# Altium schematic symbol library jlcpcb_2025_04_capacitors_extended_0402.schlib: 3594 symbols (part 13 of 20)
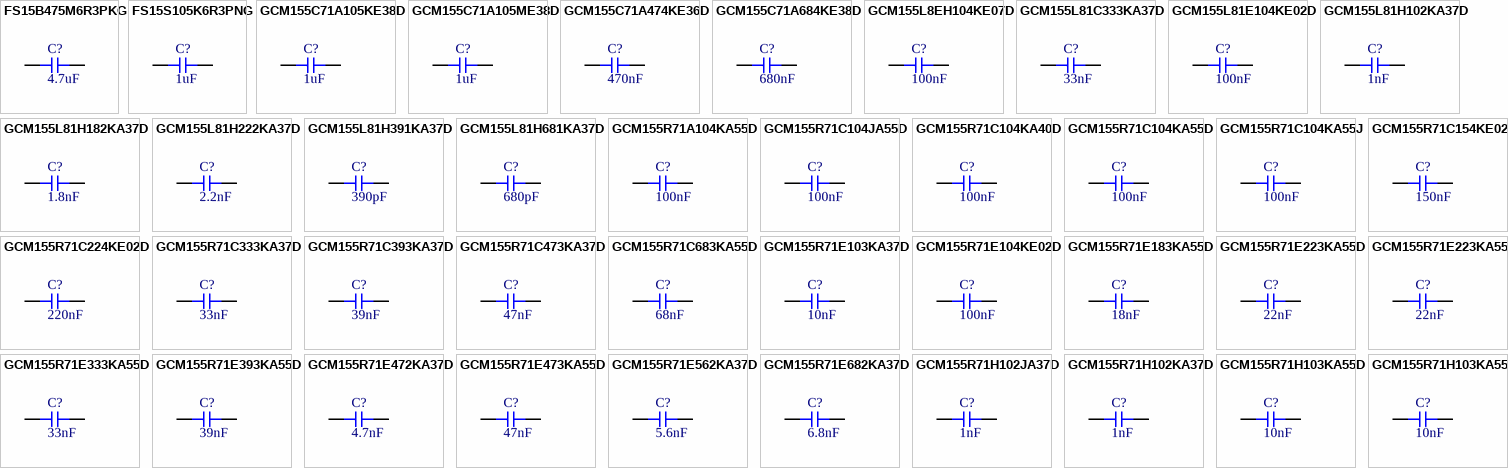
[diagram p101: symbols FS15B475M6R3PKG to GCM155R71H103KA55J]

## GCM155R71E393KA55D
designator C?  Capacitance: 39nF  (hidden comment: *)
Capacitor, Ceramic (MLCC), 39nF, ±10%, 25V, X7R, ±10%, SMD 0402; Manufacturer: Murata Electronics; Manufacturer Part Number: GCM155R71E393KA55D; Package Size: 0402; JLCPCB Basic Part: No; JLCPCB Part Number: C408119; Supplier 1: LCSC; Category: Capacitors - MLCC; Supplier Part Number 1: C408119; Tolerance: ±10%; Voltage Rating: 25V; Temperature Coefficient: X7R; RoHS: Yes; ComponentLink1Description: Datasheet; ComponentLink1URL: https://wmsc.lcsc.com/wmsc/upload/file/pdf/v2/lcsc/2304140030_Murata-Electronics-GCM155R71E393KA55D_C408119.pdf; ComponentLink2Description: JLCPCB Part URL; ComponentLink2URL: https://jlcpcb.com/partdetail/C408119; ComponentLink3Description: LCSC Part URL; ComponentLink3URL: https://lcsc.com/product-detail/Multilayer-Ceramic-Capacitors-MLCC---SMD-SMT_Murata-Electronics-Murata-Electronics-GCM155R71E393KA55D_C408119.html
footprint CAP-0402 (0402 (1005M) Capacitor)
pins: 1, 2

## GCM155R71E472KA37D
designator C?  Capacitance: 4.7nF  (hidden comment: *)
Capacitor, Ceramic (MLCC), 4.7nF, ±10%, 25V, ±10%, SMD 0402; Manufacturer: Murata Electronics; Manufacturer Part Number: GCM155R71E472KA37D; Package Size: 0402; JLCPCB Basic Part: No; JLCPCB Part Number: C701297; Supplier 1: LCSC; Category: Capacitors - MLCC; Supplier Part Number 1: C701297; Tolerance: ±10%; Voltage Rating: 25V; RoHS: Yes; ComponentLink1Description: Datasheet; ComponentLink1URL: https://wmsc.lcsc.com/wmsc/upload/file/pdf/v2/lcsc/2304140030_Murata-Electronics-GCM155R71E472KA37D_C701297.pdf; ComponentLink2Description: JLCPCB Part URL; ComponentLink2URL: https://jlcpcb.com/partdetail/C701297; ComponentLink3Description: LCSC Part URL; ComponentLink3URL: https://lcsc.com/product-detail/Multilayer-Ceramic-Capacitors-MLCC---SMD-SMT_Murata-Electronics-Murata-Electronics-GCM155R71E472KA37D_C701297.html
footprint CAP-0402 (0402 (1005M) Capacitor)
pins: 1, 2

## GCM155R71E473KA55D
designator C?  Capacitance: 47nF  (hidden comment: *)
Capacitor, Ceramic (MLCC), 47nF, ±10%, 25V, X7R, ±10%, SMD 0402; Manufacturer: Murata Electronics; Manufacturer Part Number: GCM155R71E473KA55D; Package Size: 0402; JLCPCB Basic Part: No; JLCPCB Part Number: C126529; Supplier 1: LCSC; Category: Capacitors - MLCC; Supplier Part Number 1: C126529; Tolerance: ±10%; Voltage Rating: 25V; Temperature Coefficient: X7R; RoHS: Yes; ComponentLink1Description: Datasheet; ComponentLink1URL: https://wmsc.lcsc.com/wmsc/upload/file/pdf/v2/lcsc/1811081516_Murata-Electronics-GCM155R71E473KA55D_C126529.pdf; ComponentLink2Description: JLCPCB Part URL; ComponentLink2URL: https://jlcpcb.com/partdetail/C126529; ComponentLink3Description: LCSC Part URL; ComponentLink3URL: https://lcsc.com/product-detail/Multilayer-Ceramic-Capacitors-MLCC---SMD-SMT_Murata-Electronics-Murata-Electronics-GCM155R71E473KA55D_C126529.html
footprint CAP-0402 (0402 (1005M) Capacitor)
pins: 1, 2

## GCM155R71E562KA37D
designator C?  Capacitance: 5.6nF  (hidden comment: *)
Capacitor, Ceramic (MLCC), 5.6nF, ±10%, 25V, X7R, ±10%, SMD 0402; Manufacturer: Murata Electronics; Manufacturer Part Number: GCM155R71E562KA37D; Package Size: 0402; JLCPCB Basic Part: No; JLCPCB Part Number: C2941943; Supplier 1: LCSC; Category: Capacitors - MLCC; Supplier Part Number 1: C2941943; Tolerance: ±10%; Voltage Rating: 25V; Temperature Coefficient: X7R; RoHS: Yes; ComponentLink1Description: Datasheet; ComponentLink1URL: https://wmsc.lcsc.com/wmsc/upload/file/pdf/v2/lcsc/2201121900_Murata-Electronics-GCM155R71E562KA37D_C2941943.pdf; ComponentLink2Description: JLCPCB Part URL; ComponentLink2URL: https://jlcpcb.com/partdetail/C2941943; ComponentLink3Description: LCSC Part URL; ComponentLink3URL: https://lcsc.com/product-detail/Multilayer-Ceramic-Capacitors-MLCC---SMD-SMT_Murata-Electronics-Murata-Electronics-GCM155R71E562KA37D_C2941943.html
footprint CAP-0402 (0402 (1005M) Capacitor)
pins: 1, 2

## GCM155R71E682KA37D
designator C?  Capacitance: 6.8nF  (hidden comment: *)
Capacitor, Ceramic (MLCC), 6.8nF, ±10%, 25V, X7R, ±10%, SMD 0402; Manufacturer: Murata Electronics; Manufacturer Part Number: GCM155R71E682KA37D; Package Size: 0402; JLCPCB Basic Part: No; JLCPCB Part Number: C710665; Supplier 1: LCSC; Category: Capacitors - MLCC; Supplier Part Number 1: C710665; Tolerance: ±10%; Voltage Rating: 25V; Temperature Coefficient: X7R; RoHS: Yes; ComponentLink1Description: Datasheet; ComponentLink1URL: https://wmsc.lcsc.com/wmsc/upload/file/pdf/v2/lcsc/2210190600_Murata-Electronics-GCM155R71E682KA37D_C710665.pdf; ComponentLink2Description: JLCPCB Part URL; ComponentLink2URL: https://jlcpcb.com/partdetail/C710665; ComponentLink3Description: LCSC Part URL; ComponentLink3URL: https://lcsc.com/product-detail/Multilayer-Ceramic-Capacitors-MLCC---SMD-SMT_Murata-Electronics-Murata-Electronics-GCM155R71E682KA37D_C710665.html
footprint CAP-0402 (0402 (1005M) Capacitor)
pins: 1, 2

## GCM155R71H102JA37D
designator C?  Capacitance: 1nF  (hidden comment: *)
Capacitor, Ceramic (MLCC), 1nF, ±5%, ±5%, SMD 0402; Manufacturer: Murata Electronics; Manufacturer Part Number: GCM155R71H102JA37D; Package Size: 0402; JLCPCB Basic Part: No; JLCPCB Part Number: C668319; Supplier 1: LCSC; Category: Capacitors - MLCC; Supplier Part Number 1: C668319; Tolerance: ±5%; RoHS: Yes; ComponentLink1Description: Datasheet; ComponentLink1URL: https://wmsc.lcsc.com/wmsc/upload/file/pdf/v2/lcsc/2201131030_Murata-Electronics-GCM155R71H102JA37D_C668319.pdf; ComponentLink2Description: JLCPCB Part URL; ComponentLink2URL: https://jlcpcb.com/partdetail/C668319; ComponentLink3Description: LCSC Part URL; ComponentLink3URL: https://lcsc.com/product-detail/Multilayer-Ceramic-Capacitors-MLCC---SMD-SMT_Murata-Electronics-Murata-Electronics-GCM155R71H102JA37D_C668319.html
footprint CAP-0402 (0402 (1005M) Capacitor)
pins: 1, 2

## GCM155R71H102KA37D
designator C?  Capacitance: 1nF  (hidden comment: *)
Capacitor, Ceramic (MLCC), 1nF, ±10%, 50V, X7R, ±10%, SMD 0402; Manufacturer: Murata Electronics; Manufacturer Part Number: GCM155R71H102KA37D; Package Size: 0402; JLCPCB Basic Part: No; JLCPCB Part Number: C126532; Supplier 1: LCSC; Category: Capacitors - MLCC; Supplier Part Number 1: C126532; Tolerance: ±10%; Voltage Rating: 50V; Temperature Coefficient: X7R; RoHS: Yes; ComponentLink1Description: Datasheet; ComponentLink1URL: https://wmsc.lcsc.com/wmsc/upload/file/pdf/v2/lcsc/1811081510_Murata-Electronics-GCM155R71H102KA37D_C126532.pdf; ComponentLink2Description: JLCPCB Part URL; ComponentLink2URL: https://jlcpcb.com/partdetail/C126532; ComponentLink3Description: LCSC Part URL; ComponentLink3URL: https://lcsc.com/product-detail/Multilayer-Ceramic-Capacitors-MLCC---SMD-SMT_Murata-Electronics-Murata-Electronics-GCM155R71H102KA37D_C126532.html
footprint CAP-0402 (0402 (1005M) Capacitor)
pins: 1, 2

## GCM155R71H103KA55D
designator C?  Capacitance: 10nF  (hidden comment: *)
Capacitor, Ceramic (MLCC), 10nF, ±10%, 50V, X7R, ±10%, SMD 0402; Manufacturer: Murata Electronics; Manufacturer Part Number: GCM155R71H103KA55D; Package Size: 0402; JLCPCB Basic Part: No; JLCPCB Part Number: C91601; Supplier 1: LCSC; Category: Capacitors - MLCC; Supplier Part Number 1: C91601; Tolerance: ±10%; Voltage Rating: 50V; Temperature Coefficient: X7R; RoHS: Yes; ComponentLink1Description: Datasheet; ComponentLink1URL: https://wmsc.lcsc.com/wmsc/upload/file/pdf/v2/lcsc/1811141852_Murata-Electronics-GCM155R71H103KA55D_C91601.pdf; ComponentLink2Description: JLCPCB Part URL; ComponentLink2URL: https://jlcpcb.com/partdetail/C91601; ComponentLink3Description: LCSC Part URL; ComponentLink3URL: https://lcsc.com/product-detail/Multilayer-Ceramic-Capacitors-MLCC---SMD-SMT_Murata-Electronics-Murata-Electronics-GCM155R71H103KA55D_C91601.html
footprint CAP-0402 (0402 (1005M) Capacitor)
pins: 1, 2

## GCM155R71H103KA55J
designator C?  Capacitance: 10nF  (hidden comment: *)
Capacitor, Ceramic (MLCC), 10nF, ±10%, 50V, X7R, ±10%, SMD 0402; Manufacturer: Murata Electronics; Manufacturer Part Number: GCM155R71H103KA55J; Package Size: 0402; JLCPCB Basic Part: No; JLCPCB Part Number: C2168451; Supplier 1: LCSC; Category: Capacitors - MLCC; Supplier Part Number 1: C2168451; Tolerance: ±10%; Voltage Rating: 50V; Temperature Coefficient: X7R; RoHS: Yes; ComponentLink1Description: Datasheet; ComponentLink1URL: https://wmsc.lcsc.com/wmsc/upload/file/pdf/v2/lcsc/2202040300_Murata-Electronics-GCM155R71H103KA55J_C2168451.pdf; ComponentLink2Description: JLCPCB Part URL; ComponentLink2URL: https://jlcpcb.com/partdetail/C2168451; ComponentLink3Description: LCSC Part URL; ComponentLink3URL: https://lcsc.com/product-detail/Multilayer-Ceramic-Capacitors-MLCC---SMD-SMT_Murata-Electronics-Murata-Electronics-GCM155R71H103KA55J_C2168451.html
footprint CAP-0402 (0402 (1005M) Capacitor)
pins: 1, 2

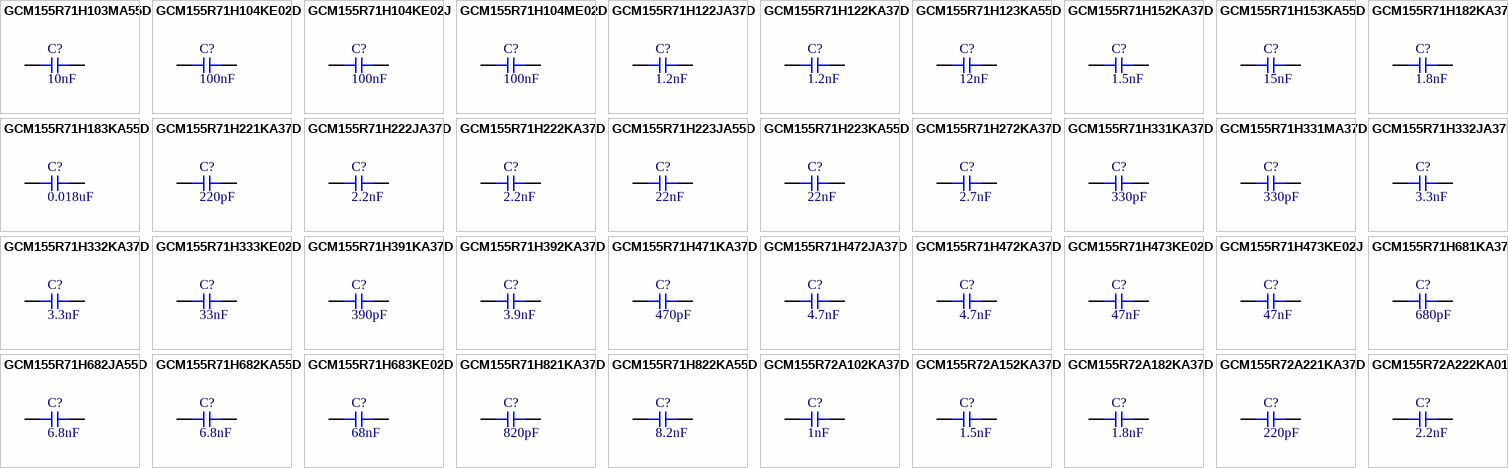
[diagram p56: symbols GCM155R71H103MA55D to GCM155R72A222KA01D]

## GCM155R71H103MA55D
designator C?  Capacitance: 10nF  (hidden comment: *)
Capacitor, Ceramic (MLCC), 10nF, ±20%, 50V, X7R, ±20%, SMD 0402; Manufacturer: Murata Electronics; Manufacturer Part Number: GCM155R71H103MA55D; Package Size: 0402; JLCPCB Basic Part: No; JLCPCB Part Number: C2941923; Supplier 1: LCSC; Category: Capacitors - MLCC; Supplier Part Number 1: C2941923; Tolerance: ±20%; Voltage Rating: 50V; Temperature Coefficient: X7R; RoHS: Yes; ComponentLink1Description: Datasheet; ComponentLink1URL: https://wmsc.lcsc.com/wmsc/upload/file/pdf/v2/lcsc/2201211500_Murata-Electronics-GCM155R71H103MA55D_C2941923.pdf; ComponentLink2Description: JLCPCB Part URL; ComponentLink2URL: https://jlcpcb.com/partdetail/C2941923; ComponentLink3Description: LCSC Part URL; ComponentLink3URL: https://lcsc.com/product-detail/Multilayer-Ceramic-Capacitors-MLCC---SMD-SMT_Murata-Electronics-Murata-Electronics-GCM155R71H103MA55D_C2941923.html
footprint CAP-0402 (0402 (1005M) Capacitor)
pins: 1, 2

## GCM155R71H104KE02D
designator C?  Capacitance: 100nF  (hidden comment: *)
Capacitor, Ceramic (MLCC), 100nF, ±10%, 50V, X7R, ±10%, SMD 0402; Manufacturer: Murata Electronics; Manufacturer Part Number: GCM155R71H104KE02D; Package Size: 0402; JLCPCB Basic Part: No; JLCPCB Part Number: C85858; Supplier 1: LCSC; Category: Capacitors - MLCC; Supplier Part Number 1: C85858; Tolerance: ±10%; Voltage Rating: 50V; Temperature Coefficient: X7R; RoHS: Yes; ComponentLink1Description: Datasheet; ComponentLink1URL: https://wmsc.lcsc.com/wmsc/upload/file/pdf/v2/lcsc/2304140030_Murata-Electronics-GCM155R71H104KE02D_C85858.pdf; ComponentLink2Description: JLCPCB Part URL; ComponentLink2URL: https://jlcpcb.com/partdetail/C85858; ComponentLink3Description: LCSC Part URL; ComponentLink3URL: https://lcsc.com/product-detail/Multilayer-Ceramic-Capacitors-MLCC---SMD-SMT_Murata-Electronics-Murata-Electronics-GCM155R71H104KE02D_C85858.html
footprint CAP-0402 (0402 (1005M) Capacitor)
pins: 1, 2

## GCM155R71H104KE02J
designator C?  Capacitance: 100nF  (hidden comment: *)
Capacitor, Ceramic (MLCC), 100nF, 50V, SMD 0402; Manufacturer: Murata Electronics; Manufacturer Part Number: GCM155R71H104KE02J; Package Size: 0402; JLCPCB Basic Part: No; JLCPCB Part Number: C2649549; Supplier 1: LCSC; Category: Capacitors - MLCC; Supplier Part Number 1: C2649549; Voltage Rating: 50V; RoHS: Yes; ComponentLink1Description: Datasheet; ComponentLink1URL: https://wmsc.lcsc.com/wmsc/upload/file/pdf/v2/lcsc/2202131630_Murata-Electronics-GCM155R71H104KE02J_C2649549.pdf; ComponentLink2Description: JLCPCB Part URL; ComponentLink2URL: https://jlcpcb.com/partdetail/C2649549; ComponentLink3Description: LCSC Part URL; ComponentLink3URL: https://lcsc.com/product-detail/Multilayer-Ceramic-Capacitors-MLCC---SMD-SMT_Murata-Electronics-Murata-Electronics-GCM155R71H104KE02J_C2649549.html
footprint CAP-0402 (0402 (1005M) Capacitor)
pins: 1, 2

## GCM155R71H104ME02D
designator C?  Capacitance: 100nF  (hidden comment: *)
Capacitor, Ceramic (MLCC), 100nF, ±20%, 50V, X7R, ±20%, SMD 0402; Manufacturer: Murata Electronics; Manufacturer Part Number: GCM155R71H104ME02D; Package Size: 0402; JLCPCB Basic Part: No; JLCPCB Part Number: C710666; Supplier 1: LCSC; Category: Capacitors - MLCC; Supplier Part Number 1: C710666; Tolerance: ±20%; Voltage Rating: 50V; Temperature Coefficient: X7R; RoHS: Yes; ComponentLink1Description: Datasheet; ComponentLink1URL: https://wmsc.lcsc.com/wmsc/upload/file/pdf/v2/lcsc/2308111600_Murata-Electronics-GCM155R71H104ME02D_C710666.pdf; ComponentLink2Description: JLCPCB Part URL; ComponentLink2URL: https://jlcpcb.com/partdetail/C710666; ComponentLink3Description: LCSC Part URL; ComponentLink3URL: https://lcsc.com/product-detail/Multilayer-Ceramic-Capacitors-MLCC---SMD-SMT_Murata-Electronics-Murata-Electronics-GCM155R71H104ME02D_C710666.html
footprint CAP-0402 (0402 (1005M) Capacitor)
pins: 1, 2

## GCM155R71H122JA37D
designator C?  Capacitance: 1.2nF  (hidden comment: *)
Capacitor, Ceramic (MLCC), 1.2nF, ±5%, 50V, X7R, ±5%, SMD 0402; Manufacturer: Murata Electronics; Manufacturer Part Number: GCM155R71H122JA37D; Package Size: 0402; JLCPCB Basic Part: No; JLCPCB Part Number: C5119306; Supplier 1: LCSC; Category: Capacitors - MLCC; Supplier Part Number 1: C5119306; Tolerance: ±5%; Voltage Rating: 50V; Temperature Coefficient: X7R; RoHS: Yes; ComponentLink1Description: Datasheet; ComponentLink1URL: https://wmsc.lcsc.com/wmsc/upload/file/pdf/v2/lcsc/2207251801_Murata-Electronics-GCM155R71H122JA37D_C5119306.pdf; ComponentLink2Description: JLCPCB Part URL; ComponentLink2URL: https://jlcpcb.com/partdetail/C5119306; ComponentLink3Description: LCSC Part URL; ComponentLink3URL: https://lcsc.com/product-detail/Multilayer-Ceramic-Capacitors-MLCC---SMD-SMT_Murata-Electronics-Murata-Electronics-GCM155R71H122JA37D_C5119306.html
footprint CAP-0402 (0402 (1005M) Capacitor)
pins: 1, 2

## GCM155R71H122KA37D
designator C?  Capacitance: 1.2nF  (hidden comment: *)
Capacitor, Ceramic (MLCC), 1.2nF, ±10%, 50V, X7R, ±10%, SMD 0402; Manufacturer: Murata Electronics; Manufacturer Part Number: GCM155R71H122KA37D; Package Size: 0402; JLCPCB Basic Part: No; JLCPCB Part Number: C393671; Supplier 1: LCSC; Category: Capacitors - MLCC; Supplier Part Number 1: C393671; Tolerance: ±10%; Voltage Rating: 50V; Temperature Coefficient: X7R; RoHS: Yes; ComponentLink1Description: Datasheet; ComponentLink1URL: https://wmsc.lcsc.com/wmsc/upload/file/pdf/v2/lcsc/1912111437_Murata-Electronics-GCM155R71H122KA37D_C393671.pdf; ComponentLink2Description: JLCPCB Part URL; ComponentLink2URL: https://jlcpcb.com/partdetail/C393671; ComponentLink3Description: LCSC Part URL; ComponentLink3URL: https://lcsc.com/product-detail/Multilayer-Ceramic-Capacitors-MLCC---SMD-SMT_Murata-Electronics-Murata-Electronics-GCM155R71H122KA37D_C393671.html
footprint CAP-0402 (0402 (1005M) Capacitor)
pins: 1, 2

## GCM155R71H123KA55D
designator C?  Capacitance: 12nF  (hidden comment: *)
Capacitor, Ceramic (MLCC), 12nF, ±10%, 50V, X7R, ±10%, SMD 0402; Manufacturer: Murata Electronics; Manufacturer Part Number: GCM155R71H123KA55D; Package Size: 0402; JLCPCB Basic Part: No; JLCPCB Part Number: C710667; Supplier 1: LCSC; Category: Capacitors - MLCC; Supplier Part Number 1: C710667; Tolerance: ±10%; Voltage Rating: 50V; Temperature Coefficient: X7R; RoHS: Yes; ComponentLink1Description: Datasheet; ComponentLink1URL: https://wmsc.lcsc.com/wmsc/upload/file/pdf/v2/lcsc/2201111430_Murata-Electronics-GCM155R71H123KA55D_C710667.pdf; ComponentLink2Description: JLCPCB Part URL; ComponentLink2URL: https://jlcpcb.com/partdetail/C710667; ComponentLink3Description: LCSC Part URL; ComponentLink3URL: https://lcsc.com/product-detail/Multilayer-Ceramic-Capacitors-MLCC---SMD-SMT_Murata-Electronics-Murata-Electronics-GCM155R71H123KA55D_C710667.html
footprint CAP-0402 (0402 (1005M) Capacitor)
pins: 1, 2

## GCM155R71H152KA37D
designator C?  Capacitance: 1.5nF  (hidden comment: *)
Capacitor, Ceramic (MLCC), 1.5nF, ±10%, 50V, X7R, ±10%, SMD 0402; Manufacturer: Murata Electronics; Manufacturer Part Number: GCM155R71H152KA37D; Package Size: 0402; JLCPCB Basic Part: No; JLCPCB Part Number: C126533; Supplier 1: LCSC; Category: Capacitors - MLCC; Supplier Part Number 1: C126533; Tolerance: ±10%; Voltage Rating: 50V; Temperature Coefficient: X7R; RoHS: Yes; ComponentLink1Description: Datasheet; ComponentLink1URL: https://wmsc.lcsc.com/wmsc/upload/file/pdf/v2/lcsc/1811081510_Murata-Electronics-GCM155R71H152KA37D_C126533.pdf; ComponentLink2Description: JLCPCB Part URL; ComponentLink2URL: https://jlcpcb.com/partdetail/C126533; ComponentLink3Description: LCSC Part URL; ComponentLink3URL: https://lcsc.com/product-detail/Multilayer-Ceramic-Capacitors-MLCC---SMD-SMT_Murata-Electronics-Murata-Electronics-GCM155R71H152KA37D_C126533.html
footprint CAP-0402 (0402 (1005M) Capacitor)
pins: 1, 2

## GCM155R71H153KA55D
designator C?  Capacitance: 15nF  (hidden comment: *)
Capacitor, Ceramic (MLCC), 15nF, ±10%, 50V, X7R, ±10%, SMD 0402; Manufacturer: Murata Electronics; Manufacturer Part Number: GCM155R71H153KA55D; Package Size: 0402; JLCPCB Basic Part: No; JLCPCB Part Number: C430702; Supplier 1: LCSC; Category: Capacitors - MLCC; Supplier Part Number 1: C430702; Tolerance: ±10%; Voltage Rating: 50V; Temperature Coefficient: X7R; RoHS: Yes; ComponentLink1Description: Datasheet; ComponentLink1URL: https://wmsc.lcsc.com/wmsc/upload/file/pdf/v2/lcsc/2304140030_Murata-Electronics-GCM155R71H153KA55D_C430702.pdf; ComponentLink2Description: JLCPCB Part URL; ComponentLink2URL: https://jlcpcb.com/partdetail/C430702; ComponentLink3Description: LCSC Part URL; ComponentLink3URL: https://lcsc.com/product-detail/Multilayer-Ceramic-Capacitors-MLCC---SMD-SMT_Murata-Electronics-Murata-Electronics-GCM155R71H153KA55D_C430702.html
footprint CAP-0402 (0402 (1005M) Capacitor)
pins: 1, 2

## GCM155R71H182KA37D
designator C?  Capacitance: 1.8nF  (hidden comment: *)
Capacitor, Ceramic (MLCC), 1.8nF, ±10%, null, X7R, ±10%, SMD 0402; Manufacturer: Murata Electronics; Manufacturer Part Number: GCM155R71H182KA37D; Package Size: 0402; JLCPCB Basic Part: No; JLCPCB Part Number: C710668; Supplier 1: LCSC; Category: Capacitors - MLCC; Supplier Part Number 1: C710668; Tolerance: ±10%; Voltage Rating: null; Temperature Coefficient: X7R; RoHS: Yes; ComponentLink1Description: Datasheet; ComponentLink1URL: https://wmsc.lcsc.com/wmsc/upload/file/pdf/v2/lcsc/2105241334_Murata-Electronics-GCM155R71H182KA37D_C710668.pdf; ComponentLink2Description: JLCPCB Part URL; ComponentLink2URL: https://jlcpcb.com/partdetail/C710668; ComponentLink3Description: LCSC Part URL; ComponentLink3URL: https://lcsc.com/product-detail/Multilayer-Ceramic-Capacitors-MLCC---SMD-SMT_Murata-Electronics-Murata-Electronics-GCM155R71H182KA37D_C710668.html
footprint CAP-0402 (0402 (1005M) Capacitor)
pins: 1, 2

## GCM155R71H183KA55D
designator C?  Capacitance: 0.018uF  (hidden comment: *)
Capacitor, Ceramic (MLCC), 0.018uF, ±10%, null, X7R, ±10%, SMD 0402; Manufacturer: Murata Electronics; Manufacturer Part Number: GCM155R71H183KA55D; Package Size: 0402; JLCPCB Basic Part: No; JLCPCB Part Number: C710669; Supplier 1: LCSC; Category: Capacitors - MLCC; Supplier Part Number 1: C710669; Tolerance: ±10%; Voltage Rating: null; Temperature Coefficient: X7R; RoHS: Yes; ComponentLink1Description: Datasheet; ComponentLink1URL: https://wmsc.lcsc.com/wmsc/upload/file/pdf/v2/lcsc/2308111601_Murata-Electronics-GCM155R71H183KA55D_C710669.pdf; ComponentLink2Description: JLCPCB Part URL; ComponentLink2URL: https://jlcpcb.com/partdetail/C710669; ComponentLink3Description: LCSC Part URL; ComponentLink3URL: https://lcsc.com/product-detail/Multilayer-Ceramic-Capacitors-MLCC---SMD-SMT_Murata-Electronics-Murata-Electronics-GCM155R71H183KA55D_C710669.html
footprint CAP-0402 (0402 (1005M) Capacitor)
pins: 1, 2

## GCM155R71H221KA37D
designator C?  Capacitance: 220pF  (hidden comment: *)
Capacitor, Ceramic (MLCC), 220pF, ±10%, 50V, X7R, ±10%, SMD 0402; Manufacturer: Murata Electronics; Manufacturer Part Number: GCM155R71H221KA37D; Package Size: 0402; JLCPCB Basic Part: No; JLCPCB Part Number: C388904; Supplier 1: LCSC; Category: Capacitors - MLCC; Supplier Part Number 1: C388904; Tolerance: ±10%; Voltage Rating: 50V; Temperature Coefficient: X7R; RoHS: Yes; ComponentLink1Description: Datasheet; ComponentLink1URL: https://wmsc.lcsc.com/wmsc/upload/file/pdf/v2/lcsc/2001071204_Murata-Electronics-GCM155R71H221KA37D_C388904.pdf; ComponentLink2Description: JLCPCB Part URL; ComponentLink2URL: https://jlcpcb.com/partdetail/C388904; ComponentLink3Description: LCSC Part URL; ComponentLink3URL: https://lcsc.com/product-detail/Multilayer-Ceramic-Capacitors-MLCC---SMD-SMT_Murata-Electronics-Murata-Electronics-GCM155R71H221KA37D_C388904.html
footprint CAP-0402 (0402 (1005M) Capacitor)
pins: 1, 2

## GCM155R71H222JA37D
designator C?  Capacitance: 2.2nF  (hidden comment: *)
Capacitor, Ceramic (MLCC), 2.2nF, ±5%, 50V, X7R, ±5%, SMD 0402; Manufacturer: Murata Electronics; Manufacturer Part Number: GCM155R71H222JA37D; Package Size: 0402; JLCPCB Basic Part: No; JLCPCB Part Number: C524552; Supplier 1: LCSC; Category: Capacitors - MLCC; Supplier Part Number 1: C524552; Tolerance: ±5%; Voltage Rating: 50V; Temperature Coefficient: X7R; RoHS: Yes; ComponentLink1Description: Datasheet; ComponentLink1URL: https://wmsc.lcsc.com/wmsc/upload/file/pdf/v2/lcsc/2304140030_Murata-Electronics-GCM155R71H222JA37D_C524552.pdf; ComponentLink2Description: JLCPCB Part URL; ComponentLink2URL: https://jlcpcb.com/partdetail/C524552; ComponentLink3Description: LCSC Part URL; ComponentLink3URL: https://lcsc.com/product-detail/Multilayer-Ceramic-Capacitors-MLCC---SMD-SMT_Murata-Electronics-Murata-Electronics-GCM155R71H222JA37D_C524552.html
footprint CAP-0402 (0402 (1005M) Capacitor)
pins: 1, 2

## GCM155R71H222KA37D
designator C?  Capacitance: 2.2nF  (hidden comment: *)
Capacitor, Ceramic (MLCC), 2.2nF, ±10%, 50V, X7R, ±10%, SMD 0402; Manufacturer: Murata Electronics; Manufacturer Part Number: GCM155R71H222KA37D; Package Size: 0402; JLCPCB Basic Part: No; JLCPCB Part Number: C126534; Supplier 1: LCSC; Category: Capacitors - MLCC; Supplier Part Number 1: C126534; Tolerance: ±10%; Voltage Rating: 50V; Temperature Coefficient: X7R; RoHS: Yes; ComponentLink1Description: Datasheet; ComponentLink1URL: https://wmsc.lcsc.com/wmsc/upload/file/pdf/v2/lcsc/1811081510_Murata-Electronics-GCM155R71H222KA37D_C126534.pdf; ComponentLink2Description: JLCPCB Part URL; ComponentLink2URL: https://jlcpcb.com/partdetail/C126534; ComponentLink3Description: LCSC Part URL; ComponentLink3URL: https://lcsc.com/product-detail/Multilayer-Ceramic-Capacitors-MLCC---SMD-SMT_Murata-Electronics-Murata-Electronics-GCM155R71H222KA37D_C126534.html
footprint CAP-0402 (0402 (1005M) Capacitor)
pins: 1, 2

## GCM155R71H223JA55D
designator C?  Capacitance: 22nF  (hidden comment: *)
Capacitor, Ceramic (MLCC), 22nF, ±5%, 50V, X7R, ±5%, SMD 0402; Manufacturer: Murata Electronics; Manufacturer Part Number: GCM155R71H223JA55D; Package Size: 0402; JLCPCB Basic Part: No; JLCPCB Part Number: C524553; Supplier 1: LCSC; Category: Capacitors - MLCC; Supplier Part Number 1: C524553; Tolerance: ±5%; Voltage Rating: 50V; Temperature Coefficient: X7R; RoHS: Yes; ComponentLink1Description: Datasheet; ComponentLink1URL: https://wmsc.lcsc.com/wmsc/upload/file/pdf/v2/lcsc/2304140030_Murata-Electronics-GCM155R71H223JA55D_C524553.pdf; ComponentLink2Description: JLCPCB Part URL; ComponentLink2URL: https://jlcpcb.com/partdetail/C524553; ComponentLink3Description: LCSC Part URL; ComponentLink3URL: https://lcsc.com/product-detail/Multilayer-Ceramic-Capacitors-MLCC---SMD-SMT_Murata-Electronics-Murata-Electronics-GCM155R71H223JA55D_C524553.html
footprint CAP-0402 (0402 (1005M) Capacitor)
pins: 1, 2

## GCM155R71H223KA55D
designator C?  Capacitance: 22nF  (hidden comment: *)
Capacitor, Ceramic (MLCC), 22nF, ±10%, 50V, X7R, ±10%, SMD 0402; Manufacturer: Murata Electronics; Manufacturer Part Number: GCM155R71H223KA55D; Package Size: 0402; JLCPCB Basic Part: No; JLCPCB Part Number: C161167; Supplier 1: LCSC; Category: Capacitors - MLCC; Supplier Part Number 1: C161167; Tolerance: ±10%; Voltage Rating: 50V; Temperature Coefficient: X7R; RoHS: Yes; ComponentLink1Description: Datasheet; ComponentLink1URL: https://wmsc.lcsc.com/wmsc/upload/file/pdf/v2/lcsc/1811081550_Murata-Electronics-GCM155R71H223KA55D_C161167.pdf; ComponentLink2Description: JLCPCB Part URL; ComponentLink2URL: https://jlcpcb.com/partdetail/C161167; ComponentLink3Description: LCSC Part URL; ComponentLink3URL: https://lcsc.com/product-detail/Multilayer-Ceramic-Capacitors-MLCC---SMD-SMT_Murata-Electronics-Murata-Electronics-GCM155R71H223KA55D_C161167.html
footprint CAP-0402 (0402 (1005M) Capacitor)
pins: 1, 2

## GCM155R71H272KA37D
designator C?  Capacitance: 2.7nF  (hidden comment: *)
Capacitor, Ceramic (MLCC), 2.7nF, ±10%, 50V, X7R, ±10%, SMD 0402; Manufacturer: Murata Electronics; Manufacturer Part Number: GCM155R71H272KA37D; Package Size: 0402; JLCPCB Basic Part: No; JLCPCB Part Number: C161168; Supplier 1: LCSC; Category: Capacitors - MLCC; Supplier Part Number 1: C161168; Tolerance: ±10%; Voltage Rating: 50V; Temperature Coefficient: X7R; RoHS: Yes; ComponentLink1Description: Datasheet; ComponentLink1URL: https://wmsc.lcsc.com/wmsc/upload/file/pdf/v2/lcsc/1811081550_Murata-Electronics-GCM155R71H272KA37D_C161168.pdf; ComponentLink2Description: JLCPCB Part URL; ComponentLink2URL: https://jlcpcb.com/partdetail/C161168; ComponentLink3Description: LCSC Part URL; ComponentLink3URL: https://lcsc.com/product-detail/Multilayer-Ceramic-Capacitors-MLCC---SMD-SMT_Murata-Electronics-Murata-Electronics-GCM155R71H272KA37D_C161168.html
footprint CAP-0402 (0402 (1005M) Capacitor)
pins: 1, 2

## GCM155R71H331KA37D
designator C?  Capacitance: 330pF  (hidden comment: *)
Capacitor, Ceramic (MLCC), 330pF, ±10%, 50V, X7R, ±10%, SMD 0402; Manufacturer: Murata Electronics; Manufacturer Part Number: GCM155R71H331KA37D; Package Size: 0402; JLCPCB Basic Part: No; JLCPCB Part Number: C437449; Supplier 1: LCSC; Category: Capacitors - MLCC; Supplier Part Number 1: C437449; Tolerance: ±10%; Voltage Rating: 50V; Temperature Coefficient: X7R; RoHS: Yes; ComponentLink1Description: Datasheet; ComponentLink1URL: https://wmsc.lcsc.com/wmsc/upload/file/pdf/v2/lcsc/2304140030_Murata-Electronics-GCM155R71H331KA37D_C437449.pdf; ComponentLink2Description: JLCPCB Part URL; ComponentLink2URL: https://jlcpcb.com/partdetail/C437449; ComponentLink3Description: LCSC Part URL; ComponentLink3URL: https://lcsc.com/product-detail/Multilayer-Ceramic-Capacitors-MLCC---SMD-SMT_Murata-Electronics-Murata-Electronics-GCM155R71H331KA37D_C437449.html
footprint CAP-0402 (0402 (1005M) Capacitor)
pins: 1, 2

## GCM155R71H331MA37D
designator C?  Capacitance: 330pF  (hidden comment: *)
Capacitor, Ceramic (MLCC), 330pF, ±20%, 50V, X7R, ±20%, SMD 0402; Manufacturer: Murata Electronics; Manufacturer Part Number: GCM155R71H331MA37D; Package Size: 0402; JLCPCB Basic Part: No; JLCPCB Part Number: C2891594; Supplier 1: LCSC; Category: Capacitors - MLCC; Supplier Part Number 1: C2891594; Tolerance: ±20%; Voltage Rating: 50V; Temperature Coefficient: X7R; RoHS: Yes; ComponentLink1Description: Datasheet; ComponentLink1URL: https://wmsc.lcsc.com/wmsc/upload/file/pdf/v2/lcsc/2109101930_Murata-Electronics-GCM155R71H331MA37D_C2891594.pdf; ComponentLink2Description: JLCPCB Part URL; ComponentLink2URL: https://jlcpcb.com/partdetail/C2891594; ComponentLink3Description: LCSC Part URL; ComponentLink3URL: https://lcsc.com/product-detail/Multilayer-Ceramic-Capacitors-MLCC---SMD-SMT_Murata-Electronics-Murata-Electronics-GCM155R71H331MA37D_C2891594.html
footprint CAP-0402 (0402 (1005M) Capacitor)
pins: 1, 2

## GCM155R71H332JA37D
designator C?  Capacitance: 3.3nF  (hidden comment: *)
Capacitor, Ceramic (MLCC), 3.3nF, ±5%, 50V, X7R, ±5%, SMD 0402; Manufacturer: Murata Electronics; Manufacturer Part Number: GCM155R71H332JA37D; Package Size: 0402; JLCPCB Basic Part: No; JLCPCB Part Number: C2181554; Supplier 1: LCSC; Category: Capacitors - MLCC; Supplier Part Number 1: C2181554; Tolerance: ±5%; Voltage Rating: 50V; Temperature Coefficient: X7R; RoHS: Yes; ComponentLink1Description: Datasheet; ComponentLink1URL: https://wmsc.lcsc.com/wmsc/upload/file/pdf/v2/lcsc/2202041200_Murata-Electronics-GCM155R71H332JA37D_C2181554.pdf; ComponentLink2Description: JLCPCB Part URL; ComponentLink2URL: https://jlcpcb.com/partdetail/C2181554; ComponentLink3Description: LCSC Part URL; ComponentLink3URL: https://lcsc.com/product-detail/Multilayer-Ceramic-Capacitors-MLCC---SMD-SMT_Murata-Electronics-Murata-Electronics-GCM155R71H332JA37D_C2181554.html
footprint CAP-0402 (0402 (1005M) Capacitor)
pins: 1, 2

## GCM155R71H332KA37D
designator C?  Capacitance: 3.3nF  (hidden comment: *)
Capacitor, Ceramic (MLCC), 3.3nF, ±10%, 50V, X7R, ±10%, SMD 0402; Manufacturer: Murata Electronics; Manufacturer Part Number: GCM155R71H332KA37D; Package Size: 0402; JLCPCB Basic Part: No; JLCPCB Part Number: C161169; Supplier 1: LCSC; Category: Capacitors - MLCC; Supplier Part Number 1: C161169; Tolerance: ±10%; Voltage Rating: 50V; Temperature Coefficient: X7R; RoHS: Yes; ComponentLink1Description: Datasheet; ComponentLink1URL: https://wmsc.lcsc.com/wmsc/upload/file/pdf/v2/lcsc/1811081550_Murata-Electronics-GCM155R71H332KA37D_C161169.pdf; ComponentLink2Description: JLCPCB Part URL; ComponentLink2URL: https://jlcpcb.com/partdetail/C161169; ComponentLink3Description: LCSC Part URL; ComponentLink3URL: https://lcsc.com/product-detail/Multilayer-Ceramic-Capacitors-MLCC---SMD-SMT_Murata-Electronics-Murata-Electronics-GCM155R71H332KA37D_C161169.html
footprint CAP-0402 (0402 (1005M) Capacitor)
pins: 1, 2

## GCM155R71H333KE02D
designator C?  Capacitance: 33nF  (hidden comment: *)
Capacitor, Ceramic (MLCC), 33nF, ±10%, 50V, X7R, ±10%, SMD 0402; Manufacturer: Murata Electronics; Manufacturer Part Number: GCM155R71H333KE02D; Package Size: 0402; JLCPCB Basic Part: No; JLCPCB Part Number: C126535; Supplier 1: LCSC; Category: Capacitors - MLCC; Supplier Part Number 1: C126535; Tolerance: ±10%; Voltage Rating: 50V; Temperature Coefficient: X7R; RoHS: Yes; ComponentLink1Description: Datasheet; ComponentLink1URL: https://wmsc.lcsc.com/wmsc/upload/file/pdf/v2/lcsc/1810201230_Murata-Electronics-GCM155R71H333KE02D_C126535.pdf; ComponentLink2Description: JLCPCB Part URL; ComponentLink2URL: https://jlcpcb.com/partdetail/C126535; ComponentLink3Description: LCSC Part URL; ComponentLink3URL: https://lcsc.com/product-detail/Multilayer-Ceramic-Capacitors-MLCC---SMD-SMT_Murata-Electronics-Murata-Electronics-GCM155R71H333KE02D_C126535.html
footprint CAP-0402 (0402 (1005M) Capacitor)
pins: 1, 2

## GCM155R71H391KA37D
designator C?  Capacitance: 390pF  (hidden comment: *)
Capacitor, Ceramic (MLCC), 390pF, ±10%, 50V, X7R, ±10%, SMD 0402; Manufacturer: Murata Electronics; Manufacturer Part Number: GCM155R71H391KA37D; Package Size: 0402; JLCPCB Basic Part: No; JLCPCB Part Number: C710670; Supplier 1: LCSC; Category: Capacitors - MLCC; Supplier Part Number 1: C710670; Tolerance: ±10%; Voltage Rating: 50V; Temperature Coefficient: X7R; RoHS: Yes; ComponentLink1Description: Datasheet; ComponentLink1URL: https://wmsc.lcsc.com/wmsc/upload/file/pdf/v2/lcsc/2201111430_Murata-Electronics-GCM155R71H391KA37D_C710670.pdf; ComponentLink2Description: JLCPCB Part URL; ComponentLink2URL: https://jlcpcb.com/partdetail/C710670; ComponentLink3Description: LCSC Part URL; ComponentLink3URL: https://lcsc.com/product-detail/Multilayer-Ceramic-Capacitors-MLCC---SMD-SMT_Murata-Electronics-Murata-Electronics-GCM155R71H391KA37D_C710670.html
footprint CAP-0402 (0402 (1005M) Capacitor)
pins: 1, 2

## GCM155R71H392KA37D
designator C?  Capacitance: 3.9nF  (hidden comment: *)
Capacitor, Ceramic (MLCC), 3.9nF, ±10%, 50V, X7R, ±10%, SMD 0402; Manufacturer: Murata Electronics; Manufacturer Part Number: GCM155R71H392KA37D; Package Size: 0402; JLCPCB Basic Part: No; JLCPCB Part Number: C161170; Supplier 1: LCSC; Category: Capacitors - MLCC; Supplier Part Number 1: C161170; Tolerance: ±10%; Voltage Rating: 50V; Temperature Coefficient: X7R; RoHS: Yes; ComponentLink1Description: Datasheet; ComponentLink1URL: https://wmsc.lcsc.com/wmsc/upload/file/pdf/v2/lcsc/1811081550_Murata-Electronics-GCM155R71H392KA37D_C161170.pdf; ComponentLink2Description: JLCPCB Part URL; ComponentLink2URL: https://jlcpcb.com/partdetail/C161170; ComponentLink3Description: LCSC Part URL; ComponentLink3URL: https://lcsc.com/product-detail/Multilayer-Ceramic-Capacitors-MLCC---SMD-SMT_Murata-Electronics-Murata-Electronics-GCM155R71H392KA37D_C161170.html
footprint CAP-0402 (0402 (1005M) Capacitor)
pins: 1, 2

## GCM155R71H471KA37D
designator C?  Capacitance: 470pF  (hidden comment: *)
Capacitor, Ceramic (MLCC), 470pF, ±10%, 50V, X7R, ±10%, SMD 0402; Manufacturer: Murata Electronics; Manufacturer Part Number: GCM155R71H471KA37D; Package Size: 0402; JLCPCB Basic Part: No; JLCPCB Part Number: C85859; Supplier 1: LCSC; Category: Capacitors - MLCC; Supplier Part Number 1: C85859; Tolerance: ±10%; Voltage Rating: 50V; Temperature Coefficient: X7R; RoHS: Yes; ComponentLink1Description: Datasheet; ComponentLink1URL: https://wmsc.lcsc.com/wmsc/upload/file/pdf/v2/lcsc/2304140030_Murata-Electronics-GCM155R71H471KA37D_C85859.pdf; ComponentLink2Description: JLCPCB Part URL; ComponentLink2URL: https://jlcpcb.com/partdetail/C85859; ComponentLink3Description: LCSC Part URL; ComponentLink3URL: https://lcsc.com/product-detail/Multilayer-Ceramic-Capacitors-MLCC---SMD-SMT_Murata-Electronics-Murata-Electronics-GCM155R71H471KA37D_C85859.html
footprint CAP-0402 (0402 (1005M) Capacitor)
pins: 1, 2

## GCM155R71H472JA37D
designator C?  Capacitance: 4.7nF  (hidden comment: *)
Capacitor, Ceramic (MLCC), 4.7nF, ±5%, 50V, X7R, ±5%, SMD 0402; Manufacturer: Murata Electronics; Manufacturer Part Number: GCM155R71H472JA37D; Package Size: 0402; JLCPCB Basic Part: No; JLCPCB Part Number: C408548; Supplier 1: LCSC; Category: Capacitors - MLCC; Supplier Part Number 1: C408548; Tolerance: ±5%; Voltage Rating: 50V; Temperature Coefficient: X7R; RoHS: Yes; ComponentLink1Description: Datasheet; ComponentLink1URL: https://wmsc.lcsc.com/wmsc/upload/file/pdf/v2/lcsc/1912111437_Murata-Electronics-GCM155R71H472JA37D_C408548.pdf; ComponentLink2Description: JLCPCB Part URL; ComponentLink2URL: https://jlcpcb.com/partdetail/C408548; ComponentLink3Description: LCSC Part URL; ComponentLink3URL: https://lcsc.com/product-detail/Multilayer-Ceramic-Capacitors-MLCC---SMD-SMT_Murata-Electronics-Murata-Electronics-GCM155R71H472JA37D_C408548.html
footprint CAP-0402 (0402 (1005M) Capacitor)
pins: 1, 2

## GCM155R71H472KA37D
designator C?  Capacitance: 4.7nF  (hidden comment: *)
Capacitor, Ceramic (MLCC), 4.7nF, ±10%, 50V, X7R, ±10%, SMD 0402; Manufacturer: Murata Electronics; Manufacturer Part Number: GCM155R71H472KA37D; Package Size: 0402; JLCPCB Basic Part: No; JLCPCB Part Number: C85860; Supplier 1: LCSC; Category: Capacitors - MLCC; Supplier Part Number 1: C85860; Tolerance: ±10%; Voltage Rating: 50V; Temperature Coefficient: X7R; RoHS: Yes; ComponentLink1Description: Datasheet; ComponentLink1URL: https://wmsc.lcsc.com/wmsc/upload/file/pdf/v2/lcsc/2304140030_Murata-Electronics-GCM155R71H472KA37D_C85860.pdf; ComponentLink2Description: JLCPCB Part URL; ComponentLink2URL: https://jlcpcb.com/partdetail/C85860; ComponentLink3Description: LCSC Part URL; ComponentLink3URL: https://lcsc.com/product-detail/Multilayer-Ceramic-Capacitors-MLCC---SMD-SMT_Murata-Electronics-Murata-Electronics-GCM155R71H472KA37D_C85860.html
footprint CAP-0402 (0402 (1005M) Capacitor)
pins: 1, 2

## GCM155R71H473KE02D
designator C?  Capacitance: 47nF  (hidden comment: *)
Capacitor, Ceramic (MLCC), 47nF, ±10%, 50V, X7R, ±10%, SMD 0402; Manufacturer: Murata Electronics; Manufacturer Part Number: GCM155R71H473KE02D; Package Size: 0402; JLCPCB Basic Part: No; JLCPCB Part Number: C368599; Supplier 1: LCSC; Category: Capacitors - MLCC; Supplier Part Number 1: C368599; Tolerance: ±10%; Voltage Rating: 50V; Temperature Coefficient: X7R; RoHS: Yes; ComponentLink1Description: Datasheet; ComponentLink1URL: https://wmsc.lcsc.com/wmsc/upload/file/pdf/v2/lcsc/2304140030_Murata-Electronics-GCM155R71H473KE02D_C368599.pdf; ComponentLink2Description: JLCPCB Part URL; ComponentLink2URL: https://jlcpcb.com/partdetail/C368599; ComponentLink3Description: LCSC Part URL; ComponentLink3URL: https://lcsc.com/product-detail/Multilayer-Ceramic-Capacitors-MLCC---SMD-SMT_Murata-Electronics-Murata-Electronics-GCM155R71H473KE02D_C368599.html
footprint CAP-0402 (0402 (1005M) Capacitor)
pins: 1, 2

## GCM155R71H473KE02J
designator C?  Capacitance: 47nF  (hidden comment: *)
Capacitor, Ceramic (MLCC), 47nF, ±10%, 50V, X7R, ±10%, SMD 0402; Manufacturer: Murata Electronics; Manufacturer Part Number: GCM155R71H473KE02J; Package Size: 0402; JLCPCB Basic Part: No; JLCPCB Part Number: C697422; Supplier 1: LCSC; Category: Capacitors - MLCC; Supplier Part Number 1: C697422; Tolerance: ±10%; Voltage Rating: 50V; Temperature Coefficient: X7R; RoHS: Yes; ComponentLink1Description: Datasheet; ComponentLink1URL: https://wmsc.lcsc.com/wmsc/upload/file/pdf/v2/lcsc/2007131538_Murata-Electronics-GCM155R71H473KE02J_C697422.pdf; ComponentLink2Description: JLCPCB Part URL; ComponentLink2URL: https://jlcpcb.com/partdetail/C697422; ComponentLink3Description: LCSC Part URL; ComponentLink3URL: https://lcsc.com/product-detail/Multilayer-Ceramic-Capacitors-MLCC---SMD-SMT_Murata-Electronics-Murata-Electronics-GCM155R71H473KE02J_C697422.html
footprint CAP-0402 (0402 (1005M) Capacitor)
pins: 1, 2

## GCM155R71H681KA37D
designator C?  Capacitance: 680pF  (hidden comment: *)
Capacitor, Ceramic (MLCC), 680pF, ±10%, 50V, X7R, ±10%, SMD 0402; Manufacturer: Murata Electronics; Manufacturer Part Number: GCM155R71H681KA37D; Package Size: 0402; JLCPCB Basic Part: No; JLCPCB Part Number: C393677; Supplier 1: LCSC; Category: Capacitors - MLCC; Supplier Part Number 1: C393677; Tolerance: ±10%; Voltage Rating: 50V; Temperature Coefficient: X7R; RoHS: Yes; ComponentLink1Description: Datasheet; ComponentLink1URL: https://wmsc.lcsc.com/wmsc/upload/file/pdf/v2/lcsc/1912111437_Murata-Electronics-GCM155R71H681KA37D_C393677.pdf; ComponentLink2Description: JLCPCB Part URL; ComponentLink2URL: https://jlcpcb.com/partdetail/C393677; ComponentLink3Description: LCSC Part URL; ComponentLink3URL: https://lcsc.com/product-detail/Multilayer-Ceramic-Capacitors-MLCC---SMD-SMT_Murata-Electronics-Murata-Electronics-GCM155R71H681KA37D_C393677.html
footprint CAP-0402 (0402 (1005M) Capacitor)
pins: 1, 2

## GCM155R71H682JA55D
designator C?  Capacitance: 6.8nF  (hidden comment: *)
Capacitor, Ceramic (MLCC), 6.8nF, ±5%, 50V, X7R, ±5%, SMD 0402; Manufacturer: Murata Electronics; Manufacturer Part Number: GCM155R71H682JA55D; Package Size: 0402; JLCPCB Basic Part: No; JLCPCB Part Number: C393679; Supplier 1: LCSC; Category: Capacitors - MLCC; Supplier Part Number 1: C393679; Tolerance: ±5%; Voltage Rating: 50V; Temperature Coefficient: X7R; RoHS: Yes; ComponentLink1Description: Datasheet; ComponentLink1URL: https://wmsc.lcsc.com/wmsc/upload/file/pdf/v2/lcsc/1912111437_Murata-Electronics-GCM155R71H682JA55D_C393679.pdf; ComponentLink2Description: JLCPCB Part URL; ComponentLink2URL: https://jlcpcb.com/partdetail/C393679; ComponentLink3Description: LCSC Part URL; ComponentLink3URL: https://lcsc.com/product-detail/Multilayer-Ceramic-Capacitors-MLCC---SMD-SMT_Murata-Electronics-Murata-Electronics-GCM155R71H682JA55D_C393679.html
footprint CAP-0402 (0402 (1005M) Capacitor)
pins: 1, 2

## GCM155R71H682KA55D
designator C?  Capacitance: 6.8nF  (hidden comment: *)
Capacitor, Ceramic (MLCC), 6.8nF, ±10%, 50V, X7R, ±10%, SMD 0402; Manufacturer: Murata Electronics; Manufacturer Part Number: GCM155R71H682KA55D; Package Size: 0402; JLCPCB Basic Part: No; JLCPCB Part Number: C161171; Supplier 1: LCSC; Category: Capacitors - MLCC; Supplier Part Number 1: C161171; Tolerance: ±10%; Voltage Rating: 50V; Temperature Coefficient: X7R; RoHS: Yes; ComponentLink1Description: Datasheet; ComponentLink1URL: https://wmsc.lcsc.com/wmsc/upload/file/pdf/v2/lcsc/1811081550_Murata-Electronics-GCM155R71H682KA55D_C161171.pdf; ComponentLink2Description: JLCPCB Part URL; ComponentLink2URL: https://jlcpcb.com/partdetail/C161171; ComponentLink3Description: LCSC Part URL; ComponentLink3URL: https://lcsc.com/product-detail/Multilayer-Ceramic-Capacitors-MLCC---SMD-SMT_Murata-Electronics-Murata-Electronics-GCM155R71H682KA55D_C161171.html
footprint CAP-0402 (0402 (1005M) Capacitor)
pins: 1, 2

## GCM155R71H683KE02D
designator C?  Capacitance: 68nF  (hidden comment: *)
Capacitor, Ceramic (MLCC), 68nF, ±10%, 50V, X7R, ±10%, SMD 0402; Manufacturer: Murata Electronics; Manufacturer Part Number: GCM155R71H683KE02D; Package Size: 0402; JLCPCB Basic Part: No; JLCPCB Part Number: C126537; Supplier 1: LCSC; Category: Capacitors - MLCC; Supplier Part Number 1: C126537; Tolerance: ±10%; Voltage Rating: 50V; Temperature Coefficient: X7R; RoHS: Yes; ComponentLink1Description: Datasheet; ComponentLink1URL: https://wmsc.lcsc.com/wmsc/upload/file/pdf/v2/lcsc/1811081521_Murata-Electronics-GCM155R71H683KE02D_C126537.pdf; ComponentLink2Description: JLCPCB Part URL; ComponentLink2URL: https://jlcpcb.com/partdetail/C126537; ComponentLink3Description: LCSC Part URL; ComponentLink3URL: https://lcsc.com/product-detail/Multilayer-Ceramic-Capacitors-MLCC---SMD-SMT_Murata-Electronics-Murata-Electronics-GCM155R71H683KE02D_C126537.html
footprint CAP-0402 (0402 (1005M) Capacitor)
pins: 1, 2
